# Altium footprint library LukaLIBRARY.PcbLib: 784 footprints (part 48 of 49)
Each footprint in its own frame and in the unit in brackets; x right, y up, seen from the top. Pads: shape width x height; smd on the part's side, far side on the other; paste and mask are expansions set on the pad; w line width, h text height; cw(c..) or ccw(c..) is an arc to the next point about the centre after c.
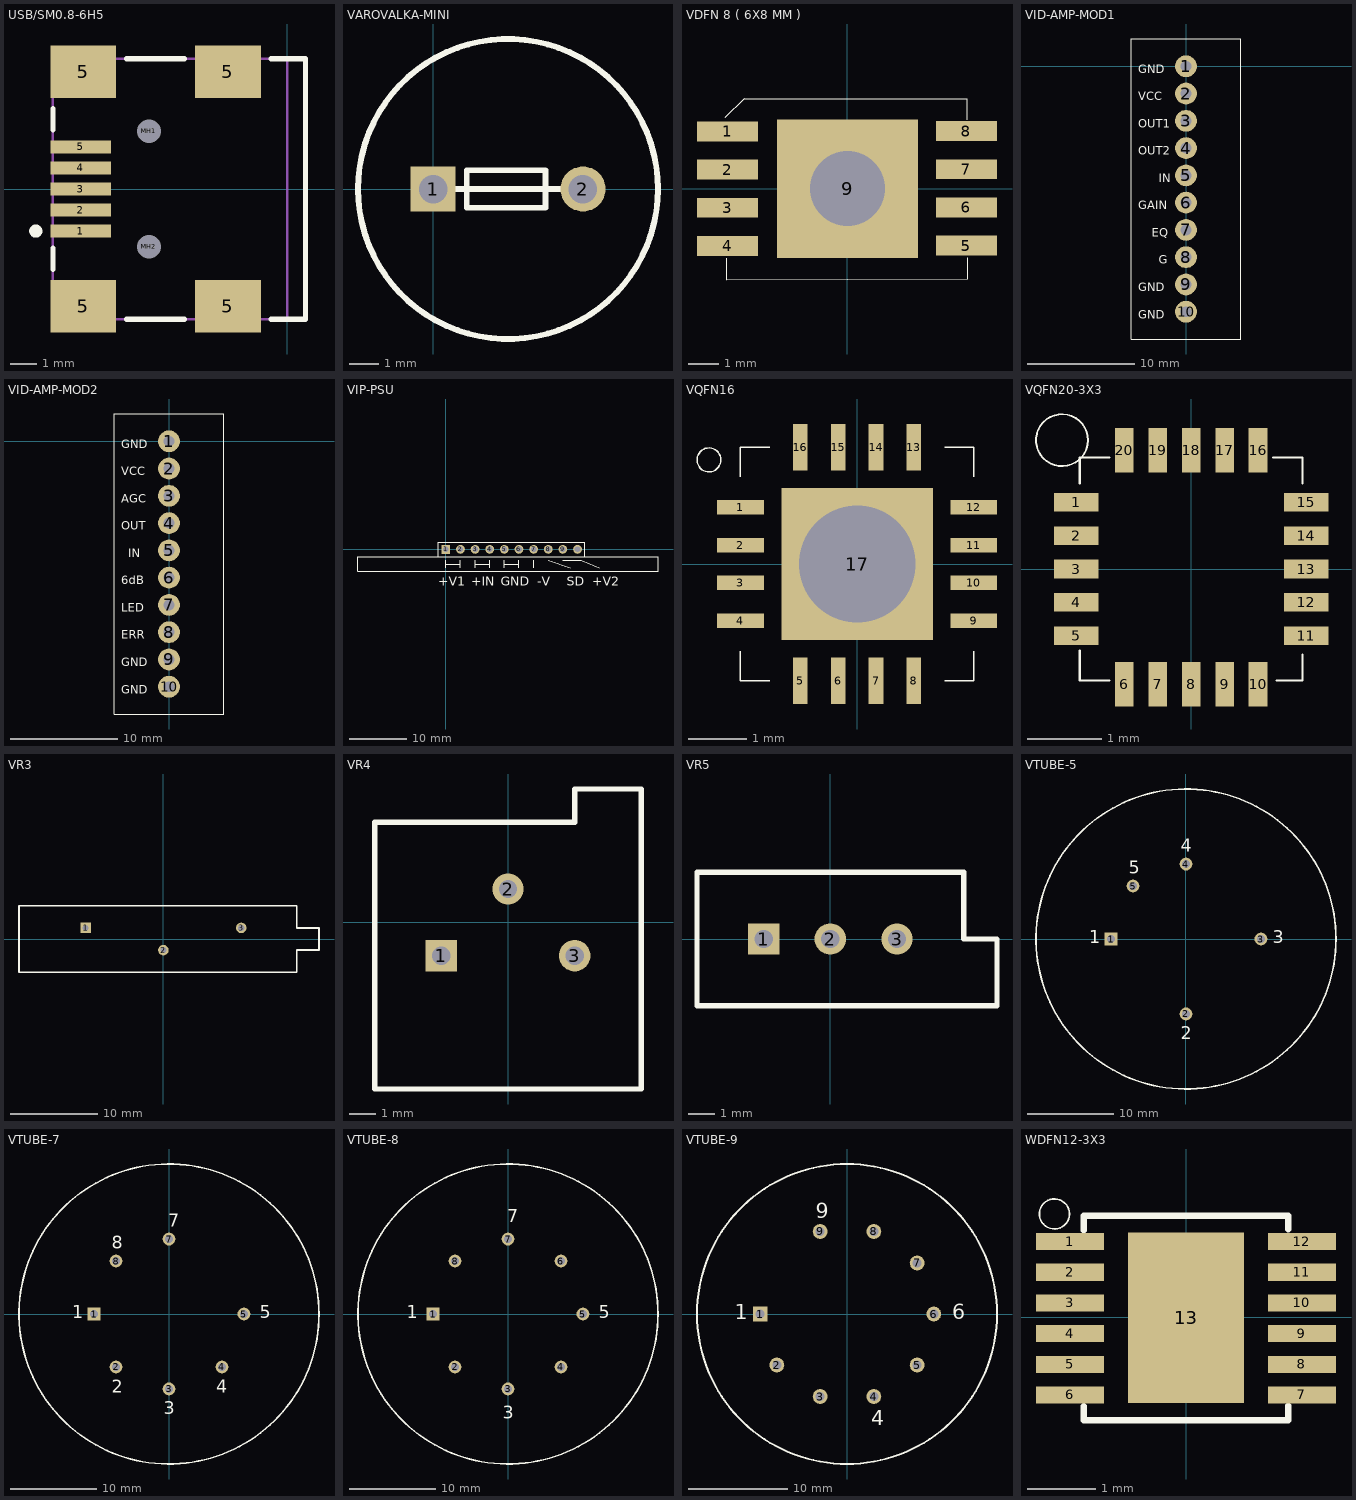
[diagram p47: the footprints below, top view; thin cyan lines are the x and y axes]

## USB/SM0.8-6H5 [mm] "Connector; USB2.0, Type B, SM; 5 Position; Right Angle"
height 3.9
pads (11):
  rect 2.3x0.5 smd: 1(-7.85,-1.6) 2(-7.85,-0.8) 3(-7.85,0) 4(-7.85,0.8) 5(-7.85,1.6)
  rect 2.5x2 smd: 5(-7.75,-4.45) 5(-7.75,4.45) 5(-2.25,-4.45) 5(-2.25,4.45)
  round 0.6 hole 0.9 unplated: MH1(-5.25,2.2) MH2(-5.25,-2.2)
Top Overlay:
  circle w0.25: c-9.55,-1.6 r0.125
  lines w0.2: -8.9,-3.05 -8.9,-2.25 ; -8.9,2.25 -8.9,3.05 ; -6.1,-4.95 -3.9,-4.95 ; -6.1,4.95 -3.9,4.95 ; -0.6,-4.95 0.7,-4.95 0.7,4.95 -0.6,4.95
Mechanical 1:
  lines w0.1: 0,-4.95 0,4.95
  text "PCB Edge" at 0.432,-4.036 h0.25
Mechanical 13:
  lines w0.1: -8.9,-4.95 0.7,-4.95 0.7,4.95 -8.9,4.95 -8.9,-4.95
3D body: height 3.9, standoff 0, extent -8.9,-4.95 0.7,4.95

## VAROVALKA-MINI [mil]
pads (2):
  rect 60x60 hole 38 mask-1000: 1(0,0)
  round 60 hole 38 mask-1000: 2(200,0)
Top Overlay:
  circle w7.87: c100,0 r200
  lines w7.87: 25,0 175,0 ; 45,-25 150,-25 150,25 45,25 45,-25
Top Solder:
  region: 200,30.26 192.17,29.23 184.87,26.2 178.6,21.4 173.79,15.13 170.77,7.83 169.74,0 170.77,-7.83 173.79,-15.13 178.6,-21.4 184.87,-26.2 192.17,-29.23 200,-30.26 207.83,-29.23 215.13,-26.2 221.4,-21.4 226.21,-15.13 229.23,-7.83 230.26,0 229.23,7.83 226.21,15.13 221.4,21.4 215.13,26.2 207.83,29.23
  region: -30,-30 30,-30 30,30 -30,30
Bottom Solder:
  region: 200,30.26 192.17,29.23 184.87,26.2 178.6,21.4 173.79,15.13 170.77,7.83 169.74,0 170.77,-7.83 173.79,-15.13 178.6,-21.4 184.87,-26.2 192.17,-29.23 200,-30.26 207.83,-29.23 215.13,-26.2 221.4,-21.4 226.21,-15.13 229.23,-7.83 230.26,0 229.23,7.83 226.21,15.13 221.4,21.4 215.13,26.2 207.83,29.23
  region: -30,-30 30,-30 30,30 -30,30

## VDFN 8 ( 6X8 MM ) [mm]
pads (9):
  rect 2.032x0.66 smd mask-25.4: 1(-3.98,1.91) 2(-3.98,0.64) 3(-3.98,-0.63) 4(-3.98,-1.9) 5(3.968,-1.89) 6(3.968,-0.62) 7(3.968,0.65) 8(3.968,1.92)
  rect 4.7x4.6 hole 2.5 unplated mask-25.4: 9(0.014,0.005)
Top Overlay:
  lines w0.025: -4.05,2.373 -3.415,3.008 ; -4,-2.31 -4,-3.02 4.01,-3 ; -3.42,3 3.99,2.99 3.99,2.3 ; 4.01,-2.99 4.01,-2.3
Top Solder:
  region: -2.336,-2.295 2.364,-2.295 2.364,2.305 -2.336,2.305
  region: 2.952,1.59 4.984,1.59 4.984,2.25 2.952,2.25
  region: 2.952,0.32 4.984,0.32 4.984,0.98 2.952,0.98
  region: 2.952,-0.95 4.984,-0.95 4.984,-0.29 2.952,-0.29
  region: 2.952,-2.22 4.984,-2.22 4.984,-1.56 2.952,-1.56
  region: -4.996,1.58 -2.964,1.58 -2.964,2.24 -4.996,2.24
  region: -4.996,0.31 -2.964,0.31 -2.964,0.97 -4.996,0.97
  region: -4.996,-0.96 -2.964,-0.96 -2.964,-0.3 -4.996,-0.3
  region: -4.996,-2.23 -2.964,-2.23 -2.964,-1.57 -4.996,-1.57
Bottom Solder:
  region: -2.336,-2.295 2.364,-2.295 2.364,2.305 -2.336,2.305

## VID-AMP-MOD1 [mil]
pads (10):
  round 80 hole 40: 1(0,0) 2(0,-100) 3(0,-200) 4(0,-300) 5(0,-400) 6(0,-500) 7(0,-600) 8(0,-700) 9(0,-800) 10(0,-900)
Top Overlay:
  lines w3.94: -200,-1000 200,-1000 200,100 -200,100 -200,-1000
  text "GND" at -175,-825 h31.25
  text "GAIN" at -175,-525 h31.25
  text "OUT1" at -175,-225 h31.25
  text "VCC" at -175,-125 h31.25
  text "GND" at -175,-25 h31.25
  text "OUT2" at -175,-325 h31.25
  text "IN" at -100,-425 h31.25
  text "G" at -100,-725 h31.25
  text "EQ" at -125,-625 h31.25
  text "GND" at -175,-925 h31.25

## VID-AMP-MOD2 [mil]
pads (10):
  round 80 hole 40: 1(0,0) 2(0,-100) 3(0,-200) 4(0,-300) 5(0,-400) 6(0,-500) 7(0,-600) 8(0,-700) 9(0,-800) 10(0,-900)
Top Overlay:
  lines w3.94: -200,-1000 -200,100 200,100 200,-1000 -200,-1000
  text "GND" at -175,-925 h31.25
  text "GND" at -175,-825 h31.25
  text "6dB" at -175,-525 h31.25
  text "LED" at -175,-625 h31.25
  text "AGC" at -175,-225 h31.25
  text "OUT" at -175,-325 h31.25
  text "GND" at -175,-25 h31.25
  text "IN" at -150,-425 h31.25
  text "ERR" at -175,-725 h31.25
  text "VCC" at -175,-125 h31.25

## VIP-PSU [mil]
pads (10):
  rect 60x60 hole 38 mask-1000: 1(0,0)
  round 60 hole 38 mask-1000: 2(100,0) 3(200,0) 4(300,0) 5(400,0) 6(500,0) 7(600,0) 8(700,0) 9(800,0) 10(900,0)
Top Overlay:
  lines w1: -50,-50 -50,50 950,50 950,-50 -50,-50
  lines w3.94: 0,-125 0,-75 ; 0,-100 100,-100 ; 100,-125 100,-75 ; 200,-125 200,-75 ; 200,-100 300,-100 ; 300,-125 300,-75 ; 400,-125 400,-75 ; 400,-100 500,-100 ; 500,-125 500,-75 ; 600,-125 600,-75 ; 700,-75 850,-125 ; 800,-75 925,-75 1050,-125 ; -600,-150 -600,-50 1450,-50 1450,-150 -600,-150
  text "+V1" at -50,-250 h62.5
  text "-V" at 625,-250 h62.5
  text "SD" at 825,-250 h62.5
  text "+IN" at 175,-250 h62.5
  text "GND" at 375,-250 h62.5
  text "+V2" at 1000,-250 h62.5
Top Solder:
  drawing of 10 lines, arcs and shapes, not listed
Bottom Solder:
  drawing of 10 lines, arcs and shapes, not listed

## VQFN16 [mm]
pads (17):
  rect 0.8x0.25 smd mask-25.4: 1(-2,0.975) 2(-2,0.325) 3(-2,-0.325) 4(-2,-0.975) 9(2,-0.975) 10(2,-0.325) 11(2,0.325) 12(2,0.975)
  rect 0.25x0.8 smd mask-25.4: 5(-0.975,-2) 6(-0.325,-2) 7(0.325,-2) 8(0.975,-2) 13(0.975,2) 14(0.325,2) 15(-0.325,2) 16(-0.975,2)
  rect 2.6x2.6 hole 2 unplated mask-25.4: 17(0,0)
Top Overlay:
  circle w0.025: c-2.54,1.785 r0.206
  lines w0.025: -2,-1.5 -2,-2 -1.5,-2 ; -2,1.5 -2,2 -1.5,2 ; 1.5,-2 2,-2 2,-1.5 ; 1.5,2 2,2 2,1.5
Top Solder:
  region: -1.3,-1.3 1.3,-1.3 1.3,1.3 -1.3,1.3
  region: 2.4,0.825 2.4,1.125 1.6,1.125 1.6,0.825
  region: 0.175,1.6 0.475,1.6 0.475,2.4 0.175,2.4
  region: 0.825,1.6 1.125,1.6 1.125,2.4 0.825,2.4
  region: 2.4,-1.125 2.4,-0.825 1.6,-0.825 1.6,-1.125
  region: 2.4,0.175 2.4,0.475 1.6,0.475 1.6,0.175
  region: 2.4,-0.475 2.4,-0.175 1.6,-0.175 1.6,-0.475
  region: 0.825,-2.4 1.125,-2.4 1.125,-1.6 0.825,-1.6
  region: 0.175,-2.4 0.475,-2.4 0.475,-1.6 0.175,-1.6
  region: -1.6,0.825 -1.6,1.125 -2.4,1.125 -2.4,0.825
  region: -0.825,2.4 -1.125,2.4 -1.125,1.6 -0.825,1.6
  region: -0.475,1.6 -0.175,1.6 -0.175,2.4 -0.475,2.4
  region: -1.6,-1.125 -1.6,-0.825 -2.4,-0.825 -2.4,-1.125
  region: -1.6,0.175 -1.6,0.475 -2.4,0.475 -2.4,0.175
  region: -1.6,-0.475 -1.6,-0.175 -2.4,-0.175 -2.4,-0.475
  region: -0.475,-2.4 -0.175,-2.4 -0.175,-1.6 -0.475,-1.6
  region: -0.825,-1.6 -1.125,-1.6 -1.125,-2.4 -0.825,-2.4
Bottom Solder:
  region: -1.3,-1.3 1.3,-1.3 1.3,1.3 -1.3,1.3

## VQFN20-3X3 [mm]
pads (20):
  rect 0.6x0.25 smd mask-25.4: 1(-1.55,0.9) 2(-1.55,0.45) 3(-1.55,0) 4(-1.55,-0.45) 5(-1.55,-0.9) 11(1.55,-0.9) 12(1.55,-0.45) 13(1.55,0) 14(1.55,0.45) 15(1.55,0.9)
  rect 0.25x0.6 smd mask-25.4: 6(-0.9,-1.55) 7(-0.45,-1.55) 8(0,-1.55) 9(0.45,-1.55) 10(0.9,-1.55) 16(0.9,1.6) 17(0.45,1.6) 18(0,1.6) 19(-0.45,1.6) 20(-0.9,1.6)
Top Overlay:
  circle w0.025: c-1.74,1.735 r0.35
  lines w0.03: -1.5,-1.1 -1.5,-1.5 -1.1,-1.5 ; -1.5,1.15 -1.5,1.5 -1.1,1.5 ; 1.1,1.5 1.5,1.5 1.5,1.15 ; 1.15,-1.5 1.5,-1.5 1.5,-1.15
Top Solder:
  region: -1.15,0.3 -1.15,0.6 -1.95,0.6 -1.95,0.3
  region: 1.15,0.6 1.15,0.3 1.95,0.3 1.95,0.6
  region: -1.15,0.75 -1.15,1.05 -1.95,1.05 -1.95,0.75
  region: -0.6,1.2 -0.3,1.2 -0.3,2 -0.6,2
  region: -0.15,1.2 0.15,1.2 0.15,2 -0.15,2
  region: 0.3,1.2 0.6,1.2 0.6,2 0.3,2
  region: 0.75,1.2 1.05,1.2 1.05,2 0.75,2
  region: -1.05,1.2 -0.75,1.2 -0.75,2 -1.05,2
  region: 1.15,1.05 1.15,0.75 1.95,0.75 1.95,1.05
  region: -1.15,-0.6 -1.15,-0.3 -1.95,-0.3 -1.95,-0.6
  region: -1.15,-0.15 -1.15,0.15 -1.95,0.15 -1.95,-0.15
  region: -1.15,-1.05 -1.15,-0.75 -1.95,-0.75 -1.95,-1.05
  region: 1.15,0.15 1.15,-0.15 1.95,-0.15 1.95,0.15
  region: 1.15,-0.3 1.15,-0.6 1.95,-0.6 1.95,-0.3
  region: 1.15,-0.75 1.15,-1.05 1.95,-1.05 1.95,-0.75
  region: 0.3,-1.95 0.6,-1.95 0.6,-1.15 0.3,-1.15
  region: 0.75,-1.95 1.05,-1.95 1.05,-1.15 0.75,-1.15
  region: -0.15,-1.95 0.15,-1.95 0.15,-1.15 -0.15,-1.15
  region: -0.6,-1.95 -0.3,-1.95 -0.3,-1.15 -0.6,-1.15
  region: -0.75,-1.15 -1.05,-1.15 -1.05,-1.95 -0.75,-1.95

## VR3 [mm] "Thru-Hole; 3 Leads"
pads (3):
  rect 1.2x1.2 hole 0.7: 1(-8.89,1.27)
  round 1.2 hole 0.7: 2(0,-1.27) 3(8.89,1.27)
Top Overlay:
  lines w0.2: -16.51,-3.81 15.24,-3.81 15.24,-1.27 17.78,-1.27 17.78,1.27 15.24,1.27 15.24,3.81 -16.51,3.81 -16.51,-3.81

## VR4 [mm] "Thru-Hole; 3 Leads"
pads (3):
  rect 1.2x1.2 hole 0.7: 1(-2.54,-1.27)
  round 1.2 hole 0.7: 2(0,1.27) 3(2.54,-1.27)
Top Overlay:
  lines w0.2: -5.08,-6.35 -5.08,3.81 2.54,3.81 2.54,5.08 5.08,5.08 5.08,-6.35 -5.08,-6.35

## VR5 [mm] "Thru-Hole; 3 Leads"
pads (3):
  rect 1.2x1.2 hole 0.7: 1(-2.54,0)
  round 1.2 hole 0.7: 2(0,0) 3(2.54,0)
Top Overlay:
  lines w0.2: -5.08,-2.54 6.35,-2.54 6.35,0 5.08,0 5.08,2.54 -5.08,2.54 -5.08,-2.54

## VTUBE-5 [mm] "Vacuum Tube; 5 Leads"
pads (5):
  rect 1.5x1.5 hole 0.9: 1(-8.725,0)
  round 1.5 hole 0.9: 2(0,-8.725) 3(8.725,0) 4(0,8.725) 5(-6.17,6.17)
Top Overlay:
  circle w0.2: c0,0 r17.462
  text "3" at 10.071,-0.508 h1.5
  text "5" at -6.693,7.62 h1.5
  text "4" at -0.597,10.16 h1.5
  text "2" at -0.597,-11.684 h1.5
  text "1" at -11.265,-0.508 h1.5

## VTUBE-7 [mm] "Vacuum Tube; 7 Leads"
height 108
pads (7):
  rect 1.5x1.5 hole 0.9: 1(-8.725,0)
  round 1.5 hole 0.9: 2(-6.17,-6.17) 3(0,-8.725) 4(6.17,-6.17) 5(8.725,0) 7(0,8.725) 8(-6.17,6.17)
Top Overlay:
  circle w0.2: c0,0 r17.462
  text "1" at -11.265,-0.508 h1.5
  text "2" at -6.693,-9.144 h1.5
  text "3" at -0.597,-11.684 h1.5
  text "4" at 5.499,-9.144 h1.5
  text "5" at 10.579,-0.508 h1.5
  text "7" at -0.089,10.16 h1.5
  text "8" at -6.693,7.62 h1.5

## VTUBE-8 [mm] "Vacuum Tube; 8 Leads"
height 108
pads (8):
  rect 1.5x1.5 hole 0.9: 1(-8.725,0)
  round 1.5 hole 0.9: 2(-6.17,-6.17) 3(0,-8.725) 4(6.17,-6.17) 5(8.725,0) 6(6.17,6.17) 7(0,8.725) 8(-6.17,6.17)
Top Overlay:
  circle w0.2: c0,0 r17.462
  text "7" at -0.089,10.668 h1.5
  text "5" at 10.579,-0.508 h1.5
  text "3" at -0.597,-12.192 h1.5
  text "1" at -11.773,-0.508 h1.5

## VTUBE-9 [mm] "Vacuum Tube; 9 Leads"
height 66.7
pads (9):
  rect 1.5x1.5 hole 0.9: 1(-8.725,0)
  round 1.5 hole 0.9: 2(-7.059,-5.128) 3(-2.696,-8.298) 4(2.696,-8.298) 5(7.059,-5.128) 6(8.725,0) 7(7.059,5.128) 8(2.696,8.298) 9(-2.696,8.298)
Top Overlay:
  circle w0.2: c0,0 r15.081
  text "4" at 2.451,-11.176 h1.5
  text "6" at 10.579,-0.508 h1.5
  text "9" at -3.137,9.652 h1.5
  text "1" at -11.265,-0.508 h1.5

## WDFN12-3X3 [mm]
pads (13):
  rect 1x0.25 smd mask-25.4: 1(-1.7,1.11) 2(-1.7,0.66) 3(-1.7,0.21) 4(-1.7,-0.24) 5(-1.7,-0.69) 6(-1.7,-1.14) 7(1.7,-1.14) 8(1.7,-0.69) 9(1.7,-0.24) 10(1.7,0.21) 11(1.7,0.66) 12(1.7,1.11)
  rect 1.7x2.5 smd mask-25.4: 13(0,-0.01)
Top Overlay:
  circle w0.025: c-1.93,1.515 r0.221
  lines w0.1: -1.5,-1.31 -1.5,-1.51 1.5,-1.51 1.5,-1.3 ; -1.5,1.28 -1.5,1.49 1.5,1.49 1.5,1.29
Top Solder:
  region: 2.2,-1.265 2.2,-1.015 1.2,-1.015 1.2,-1.265
  region: 2.2,-0.815 2.2,-0.565 1.2,-0.565 1.2,-0.815
  region: 2.2,-0.365 2.2,-0.115 1.2,-0.115 1.2,-0.365
  region: -1.2,-0.365 -1.2,-0.115 -2.2,-0.115 -2.2,-0.365
  region: -1.2,-0.815 -1.2,-0.565 -2.2,-0.565 -2.2,-0.815
  region: -2.2,-1.015 -2.2,-1.265 -1.2,-1.265 -1.2,-1.015
  region: 1.2,0.785 1.2,0.535 2.2,0.535 2.2,0.785
  region: 1.2,1.235 1.2,0.985 2.2,0.985 2.2,1.235
  region: -1.2,0.535 -1.2,0.785 -2.2,0.785 -2.2,0.535
  region: -1.2,0.985 -1.2,1.235 -2.2,1.235 -2.2,0.985
  region: -1.35,1.34 -1.35,-1.36 1.35,-1.36 1.35,1.34
  region: 2.2,0.085 2.2,0.335 1.2,0.335 1.2,0.085
  region: -1.2,0.085 -1.2,0.335 -2.2,0.335 -2.2,0.085